# Altium footprint library lib_datalogger.PcbLib: 866 footprints (part 44 of 55)
Each footprint in its own frame and in the unit in brackets; x right, y up, seen from the top. Pads: shape width x height; smd on the part's side, far side on the other; paste and mask are expansions set on the pad; w line width, h text height; cw(c..) or ccw(c..) is an arc to the next point about the centre after c.
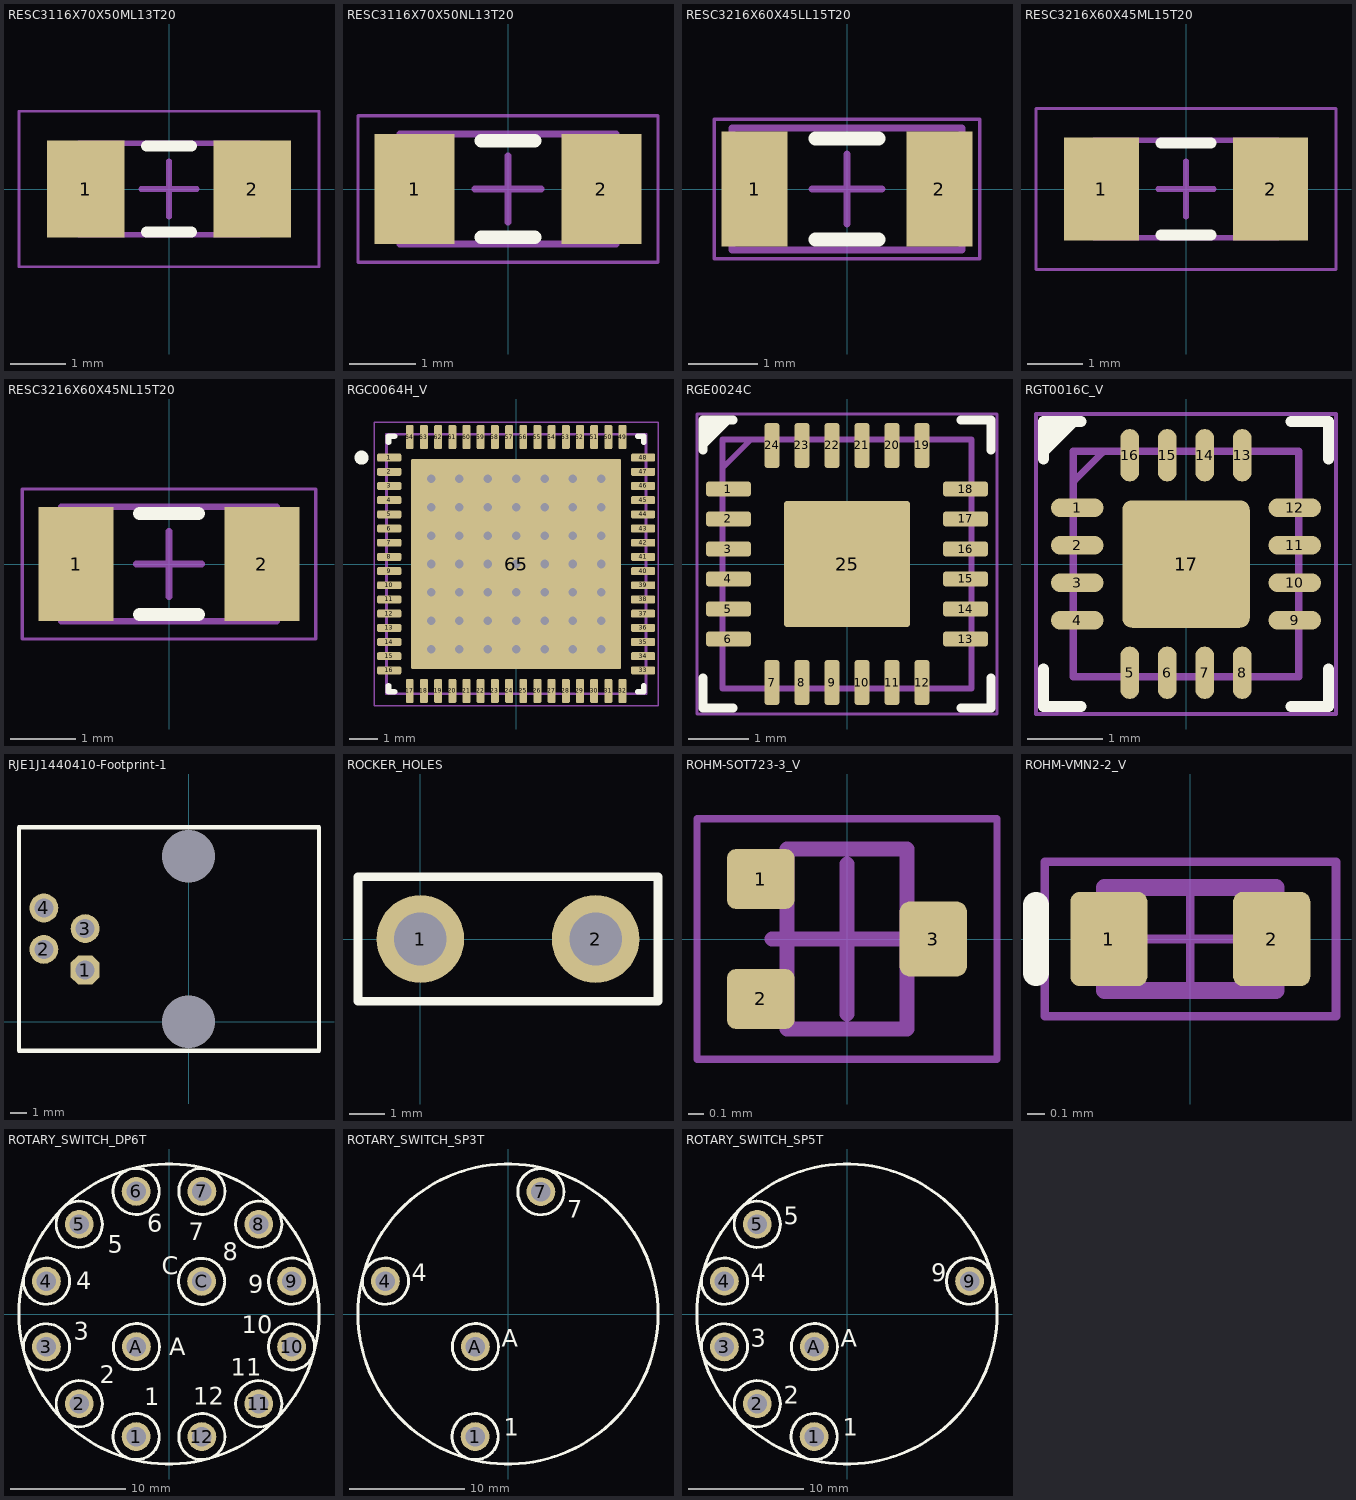
[diagram p43: the footprints below, top view; thin cyan lines are the x and y axes]

## RESC3116X70X50ML13T20 [mm] "Chip Resistor, 2-Leads, Body 3.25x1.65mm, IPC Low Density"
height 0.7
pads (2):
  rect 1.4x1.75 smd: 1(-1.5,0) 2(1.5,0)
Top Overlay:
  lines w0.2: -0.4,-0.775 0.4,-0.775 ; -0.4,0.775 0.4,0.775
Mechanical 13:
  lines w0.1: -1.625,-0.825 1.625,-0.825 1.625,0.825 -1.625,0.825 -1.625,-0.825
Mechanical 15:
  lines w0.05: -2.7,-1.4 2.7,-1.4 2.7,1.4 -2.7,1.4 -2.7,-1.4
  lines w0.1: -0.5,0 0.5,0 ; 0,-0.5 0,0.5
3D body "RESC3115X07M.step": height 0.7, standoff 0, extent -1.625,-0.825 1.625,0.825

## RESC3116X70X50NL13T20 [mm] "Chip Resistor, 2-Leads, Body 3.25x1.65mm, IPC Medium Density"
height 0.7
pads (2):
  rect 1.2x1.65 smd: 1(-1.4,0) 2(1.4,0)
Top Overlay:
  lines w0.2: -0.4,-0.725 0.4,-0.725 ; -0.4,0.725 0.4,0.725
Mechanical 13:
  lines w0.1: -1.625,-0.825 1.625,-0.825 1.625,0.825 -1.625,0.825 -1.625,-0.825
Mechanical 15:
  lines w0.05: -2.25,-1.1 2.25,-1.1 2.25,1.1 -2.25,1.1 -2.25,-1.1
  lines w0.1: -0.5,0 0.5,0 ; 0,-0.5 0,0.5
3D body "RESC3115X07N.step": height 0.7, standoff 0, extent -1.625,-0.825 1.625,0.825

## RESC3216X60X45LL15T20 [mm] "Chip Resistor, 2-Leads, Body 3.3x1.75mm, IPC High Density"
height 0.6
pads (2):
  rect 0.95x1.65 smd: 1(-1.325,0) 2(1.325,0)
Top Overlay:
  lines w0.2: -0.45,-0.725 0.45,-0.725 ; -0.45,0.725 0.45,0.725
Mechanical 13:
  lines w0.1: -1.65,-0.875 1.65,-0.875 1.65,0.875 -1.65,0.875 -1.65,-0.875
Mechanical 15:
  lines w0.05: -1.9,-1 1.9,-1 1.9,1 -1.9,1 -1.9,-1
  lines w0.1: -0.5,0 0.5,0 ; 0,-0.5 0,0.5
3D body "RESC3116X06L.step": height 0.6, standoff 0, extent -1.65,-0.875 1.65,0.875

## RESC3216X60X45ML15T20 [mm] "Chip Resistor, 2-Leads, Body 3.3x1.75mm, IPC Low Density"
height 0.6
pads (2):
  rect 1.35x1.85 smd: 1(-1.525,0) 2(1.525,0)
Top Overlay:
  lines w0.2: -0.45,-0.825 0.45,-0.825 ; -0.45,0.825 0.45,0.825
Mechanical 13:
  lines w0.1: -1.65,-0.875 1.65,-0.875 1.65,0.875 -1.65,0.875 -1.65,-0.875
Mechanical 15:
  lines w0.05: -2.7,-1.45 2.7,-1.45 2.7,1.45 -2.7,1.45 -2.7,-1.45
  lines w0.1: -0.5,0 0.5,0 ; 0,-0.5 0,0.5
3D body "RESC3116X06M.step": height 0.6, standoff 0, extent -1.65,-0.875 1.65,0.875

## RESC3216X60X45NL15T20 [mm] "Chip Resistor, 2-Leads, Body 3.3x1.75mm, IPC Medium Density"
height 0.6
pads (2):
  rect 1.15x1.75 smd: 1(-1.425,0) 2(1.425,0)
Top Overlay:
  lines w0.2: -0.45,-0.775 0.45,-0.775 ; -0.45,0.775 0.45,0.775
Mechanical 13:
  lines w0.1: -1.65,-0.875 1.65,-0.875 1.65,0.875 -1.65,0.875 -1.65,-0.875
Mechanical 15:
  lines w0.05: -2.25,-1.15 2.25,-1.15 2.25,1.15 -2.25,1.15 -2.25,-1.15
  lines w0.1: -0.5,0 0.5,0 ; 0,-0.5 0,0.5
3D body "RESC3116X06N.step": height 0.6, standoff 0, extent -1.65,-0.875 1.65,0.875

## RGC0064H_V [mm] "QFN, 64-Leads, Body 9x9mm, Pitch 0.5mm, Thermal Pad 7.4x7.4mm, TI Recommend"
height 1
pads (65):
  rrect36% 0.85x0.28 smd paste-0.025: 1(-4.475,3.75) 2(-4.475,3.25) 3(-4.475,2.75) 4(-4.475,2.25) 5(-4.475,1.75) 6(-4.475,1.25) 7(-4.475,0.75) 8(-4.475,0.25) 9(-4.475,-0.25) 10(-4.475,-0.75) 11(-4.475,-1.25) 12(-4.475,-1.75) 13(-4.475,-2.25) 14(-4.475,-2.75) 15(-4.475,-3.25) 16(-4.475,-3.75) 33(4.475,-3.75) 34(4.475,-3.25) 35(4.475,-2.75) 36(4.475,-2.25) 37(4.475,-1.75) 38(4.475,-1.25) 39(4.475,-0.75) 40(4.475,-0.25) 41(4.475,0.25) 42(4.475,0.75) 43(4.475,1.25) 44(4.475,1.75) 45(4.475,2.25) 46(4.475,2.75) 47(4.475,3.25) 48(4.475,3.75)
  rrect36% 0.28x0.85 smd paste-0.025: 17(-3.75,-4.475) 18(-3.25,-4.475) 19(-2.75,-4.475) 20(-2.25,-4.475) 21(-1.75,-4.475) 22(-1.25,-4.475) 23(-0.75,-4.475) 24(-0.25,-4.475) 25(0.25,-4.475) 26(0.75,-4.475) 27(1.25,-4.475) 28(1.75,-4.475) 29(2.25,-4.475) 30(2.75,-4.475) 31(3.25,-4.475) 32(3.75,-4.475) 49(3.75,4.475) 50(3.25,4.475) 51(2.75,4.475) 52(2.25,4.475) 53(1.75,4.475) 54(1.25,4.475) 55(0.75,4.475) 56(0.25,4.475) 57(-0.25,4.475) 58(-0.75,4.475) 59(-1.25,4.475) 60(-1.75,4.475) 61(-2.25,4.475) 62(-2.75,4.475) 63(-3.25,4.475) 64(-3.75,4.475)
  rrect1% 7.4x7.4 smd paste-4: 65(0,0)
via 1,-3 diameter 0.5 hole 0.3
via 2,-3 diameter 0.5 hole 0.3
via 3,-3 diameter 0.5 hole 0.3
via 1,-2 diameter 0.5 hole 0.3
via 2,-2 diameter 0.5 hole 0.3
via 3,-2 diameter 0.5 hole 0.3
via 1,-1 diameter 0.5 hole 0.3
via 2,-1 diameter 0.5 hole 0.3
via 3,-1 diameter 0.5 hole 0.3
via 1,0 diameter 0.5 hole 0.3
via 2,0 diameter 0.5 hole 0.3
via 3,0 diameter 0.5 hole 0.3
via 1,1 diameter 0.5 hole 0.3
via 2,1 diameter 0.5 hole 0.3
via 3,1 diameter 0.5 hole 0.3
via 1,2 diameter 0.5 hole 0.3
via 2,2 diameter 0.5 hole 0.3
via 3,2 diameter 0.5 hole 0.3
via 1,3 diameter 0.5 hole 0.3
via 2,3 diameter 0.5 hole 0.3
via 3,3 diameter 0.5 hole 0.3
via -2,-3 diameter 0.5 hole 0.3
via -1,-3 diameter 0.5 hole 0.3
via 0,-3 diameter 0.5 hole 0.3
via -2,-2 diameter 0.5 hole 0.3
via -1,-2 diameter 0.5 hole 0.3
via 0,-2 diameter 0.5 hole 0.3
via -2,-1 diameter 0.5 hole 0.3
via -1,-1 diameter 0.5 hole 0.3
via 0,-1 diameter 0.5 hole 0.3
via -2,1 diameter 0.5 hole 0.3
via -1,1 diameter 0.5 hole 0.3
via 0,1 diameter 0.5 hole 0.3
via -2,2 diameter 0.5 hole 0.3
via -1,2 diameter 0.5 hole 0.3
via 0,2 diameter 0.5 hole 0.3
via -2,3 diameter 0.5 hole 0.3
via -1,3 diameter 0.5 hole 0.3
via 0,3 diameter 0.5 hole 0.3
via -3,1 diameter 0.5 hole 0.3
via -3,2 diameter 0.5 hole 0.3
via -3,3 diameter 0.5 hole 0.3
via -3,-3 diameter 0.5 hole 0.3
via -3,-2 diameter 0.5 hole 0.3
via -3,-1 diameter 0.5 hole 0.3
via -3,0 diameter 0.5 hole 0.3
via -2,0 diameter 0.5 hole 0.3
via -1,0 diameter 0.5 hole 0.3
via 0,0 diameter 0.5 hole 0.3
Top Overlay:
  circle w0.25: c-5.45,3.75 r0.125
  lines w0.2: -4.5,-4.29 -4.5,-4.5 -4.29,-4.5 ; -4.5,4.29 -4.5,4.5 -4.29,4.5 ; 4.29,-4.5 4.5,-4.5 4.5,-4.29 ; 4.29,4.5 4.5,4.5 4.5,4.29
Top Paste:
  region: 1.65,-0.15 0.15,-0.15 0.15,-1.65 1.65,-1.65
  region: 3.45,-0.15 1.95,-0.15 1.95,-1.65 3.45,-1.65
  rectangle: -3.45,-1.65 -1.95,-0.15
  rectangle: -1.65,-1.65 -0.15,-0.15
  rectangle: -1.65,0.15 -0.15,1.65
  rectangle: -3.45,0.15 -1.95,1.65
  region: 3.45,1.65 1.95,1.65 1.95,0.15 3.45,0.15
  region: 1.65,1.65 0.15,1.65 0.15,0.15 1.65,0.15
  rectangle: -1.65,1.95 -0.15,3.45
  rectangle: -3.45,1.95 -1.95,3.45
  region: 3.45,3.45 1.95,3.45 1.95,1.95 3.45,1.95
  region: 1.65,3.45 0.15,3.45 0.15,1.95 1.65,1.95
  region: 1.65,-1.95 0.15,-1.95 0.15,-3.45 1.65,-3.45
  region: 3.45,-1.95 1.95,-1.95 1.95,-3.45 3.45,-3.45
  rectangle: -3.45,-3.45 -1.95,-1.95
  rectangle: -1.65,-3.45 -0.15,-1.95
Mechanical 1:
  text ".Designator" at -1.524,-0.508 h1.02
Mechanical 13:
  lines w0.1: -4.575,-4.575 4.575,-4.575 4.575,4.575 -4.575,4.575 -4.575,-4.575
Mechanical 15:
  lines w0.05: -5,-5 5,-5 5,5 -5,5 -5,-5
  lines w0.1: -0.5,0 0.5,0 ; 0,-0.5 0,0.5
3D body "PQFN50P900X900X100_HS-65N.step": height 1, standoff 0, extent -4.575,-4.575 4.575,4.575

## RGE0024C [mm] "QFN, 24-Leads, Body 4x4mm, Pitch 0.5mm, Thermal Pad 2.1x2.1mm"
height 1
pads (25):
  rrect42% 0.75x0.25 smd: 1(-1.975,1.25) 2(-1.975,0.75) 3(-1.975,0.25) 4(-1.975,-0.25) 5(-1.975,-0.75) 6(-1.975,-1.25) 13(1.975,-1.25) 14(1.975,-0.75) 15(1.975,-0.25) 16(1.975,0.25) 17(1.975,0.75) 18(1.975,1.25)
  rrect42% 0.25x0.75 smd: 7(-1.25,-1.975) 8(-0.75,-1.975) 9(-0.25,-1.975) 10(0.25,-1.975) 11(0.75,-1.975) 12(1.25,-1.975) 19(1.25,1.975) 20(0.75,1.975) 21(0.25,1.975) 22(-0.25,1.975) 23(-0.75,1.975) 24(-1.25,1.975)
  rrect5% 2.1x2.1 smd paste-1.05: 25(0,0)
Top Overlay:
  region: -2.4,2.4 -2.4,2 -2,2.4
  lines w0.15: -2.4,-1.9 -2.4,-2.4 -1.9,-2.4 ; -2.4,1.9 -2.4,2.4 -1.9,2.4 ; -2.4,2 -2,2.4 ; 1.9,-2.4 2.4,-2.4 2.4,-1.9 ; 1.9,2.4 2.4,2.4 2.4,1.9
Top Paste:
  rectangle: 0.1,0.1 1.039,1.039
  region: -0.1,1.039 -1.039,1.039 -1.039,0.1 -0.1,0.1
  region: -0.1,-0.1 -1.039,-0.1 -1.039,-1.039 -0.1,-1.039
  rectangle: 0.1,-1.039 1.039,-0.1
Mechanical 13:
  lines w0.1: -2.075,1.6 -1.6,2.075 ; -2.075,-2.075 -2.075,2.075 2.075,2.075 2.075,-2.075 -2.075,-2.075
Mechanical 15:
  lines w0.05: -2.5,-2.5 -2.5,2.5 2.5,2.5 2.5,-2.5 -2.5,-2.5
  lines w0.1: -0.5,0 0.5,0 ; 0,-0.5 0,0.5
Top Designator:
  text ".Designator" at -1.854,-0.508 h0.6
3D body "pca9555_RGE24_2P1X2P1.stp": height 1, standoff 0, extent -2.126,-2.126 2.126,2.126

## RGT0016C_V [mm] "QFN, 16-Leads, Body 3x3mm, Pitch 0.5mm, Thermal Pad 1.65x1.65mm"
height 1
pads (17):
  rrect100% 0.7x0.25 smd: 1(-1.45,0.75) 2(-1.45,0.25) 3(-1.45,-0.25) 4(-1.45,-0.75) 9(1.45,-0.75) 10(1.45,-0.25) 11(1.45,0.25) 12(1.45,0.75)
  rrect100% 0.25x0.7 smd: 5(-0.75,-1.45) 6(-0.25,-1.45) 7(0.25,-1.45) 8(0.75,-1.45) 13(0.75,1.45) 14(0.25,1.45) 15(-0.25,1.45) 16(-0.75,1.45)
  rrect15% 1.7x1.7 smd: 17(0,0)
Top Overlay:
  region: -1.9,1.9 -1.9,1.5 -1.5,1.9
  lines w0.15: -1.9,-1.4 -1.9,-1.9 -1.4,-1.9 ; -1.9,1.4 -1.9,1.9 -1.4,1.9 ; -1.9,1.5 -1.5,1.9 ; 1.4,-1.9 1.9,-1.9 1.9,-1.4 ; 1.4,1.9 1.9,1.9 1.9,1.4
Mechanical 13:
  lines w0.1: -1.5,1.1 -1.1,1.5 ; -1.5,-1.5 1.5,-1.5 1.5,1.5 -1.5,1.5 -1.5,-1.5
Mechanical 15:
  lines w0.05: -2,-2 2,-2 2,2 -2,2 -2,-2
  lines w0.1: -0.5,0 0.5,0 ; 0,-0.5 0,0.5
Top Designator:
  text ".Designator" at -1.524,-0.4 h0.6
3D body "QFN-16.STEP": height 0.97, standoff 0, extent -1.501,-1.501 1.501,1.501

## RJE1J1440410-Footprint-1 [mil]
pads (6):
  oct 70x70 hole 46: 1(-250,125)
  round 70 hole 46: 2(-350,175) 3(-250,225) 4(-350,275)
  round 0 hole 128: 5(0,0) 6(0,400)
Top Overlay:
  lines w10: -410,-70 -410,470 315,470 315,-70 -410,-70
3D body "ACC-M-RJE02-164-0X21-REVT1.step": height 636.92, standoff -136.7, extent -394.92,-115.08 414.92,505

## ROCKER_HOLES [mm]
pads (2):
  round 2.5 hole 1.5: 1(0,0) 2(5,0)
Top Overlay:
  lines w0.254: -1.782,-1.778 -1.782,1.778 6.782,1.778 6.782,-1.778 -1.782,-1.778

## ROCKER_SWITCH [mm]
3D body "ROCKER_SWITCH.step": height 5, standoff -24.18, extent 0,-21.082 9.5,0

## ROHM-SOT723-3_V [mm] "SOT723, 3-Leads, Body 1.2x0.8mm, Pitch 0.8mm"
height 0.55
pads (3):
  rrect30% 0.45x0.4 smd: 1(-0.575,0.4) 2(-0.575,-0.4)
  rrect30% 0.45x0.5 smd: 3(0.575,0)
Mechanical 13:
  lines w0.1: -0.4,-0.6 -0.4,0.6 0.4,0.6 0.4,-0.6 -0.4,-0.6
Mechanical 15:
  lines w0.05: -1,-0.8 1,-0.8 1,0.8 -1,0.8 -1,-0.8
  lines w0.1: -0.5,0 0.5,0 ; 0,-0.5 0,0.5
Top Designator:
  text ".Designator" at -1.27,-0.127 h0.6
3D body "SOT-723.STEP": height 0.45, standoff -0.01, extent -0.525,-0.625 0.525,0.625

## ROHM-VMN2-2_V [mm] "VMN2, 2-Leads, Body 0.9x0.6mm, Pitch 0.95mm"
height 0.4
pads (2):
  rrect25% 0.45x0.55 smd: 1(-0.475,0) 2(0.475,0)
Top Overlay:
  lines w0.15: -0.9,-0.2 -0.9,0.2
Mechanical 13:
  lines w0.1: -0.5,-0.3 -0.5,0.3 0.5,0.3 0.5,-0.3 -0.5,-0.3
Mechanical 15:
  lines w0.05: -0.275,0 0.275,0 ; 0,-0.275 0,0.275 ; -0.85,-0.45 -0.85,0.45 0.85,0.45 0.85,-0.45 -0.85,-0.45
Top Designator:
  text ".Designator" at -1.27,-0.127 h0.6
3D body "VMN2.STEP": height 0.37, standoff -0.01, extent -0.5,-0.3 0.5,0.3

## ROTARY_SWITCH_DP6T [mm]
pads (14):
  round 2.5 hole 1.7: 1(-2.847,-10.625) 2(-7.778,-7.778) 3(-10.625,-2.847) 4(-10.625,2.847) 5(-7.778,7.778) 6(-2.847,10.625) 7(2.847,10.625) 8(7.778,7.778) 9(10.625,2.847) 10(10.625,-2.847) 11(7.778,-7.778) 12(2.847,-10.625) A(-2.828,-2.828) C(2.828,2.828)
Top Overlay:
  circle w0.254: c2.828,2.828 r2
  circle w0.254: c2.847,-10.625 r2
  circle w0.254: c7.778,-7.778 r2
  circle w0.254: c10.625,-2.847 r2
  circle w0.254: c10.625,2.847 r2
  circle w0.254: c7.778,7.778 r2
  circle w0.254: c2.847,10.625 r2
  circle w0.254: c-2.847,10.625 r2
  circle w0.254: c-2.828,-2.828 r2
  circle w0.254: c-7.778,7.778 r2
  circle w0.254: c-10.625,2.847 r2
  circle w0.254: c-10.625,-2.847 r2
  circle w0.254: c-7.778,-7.778 r2
  circle w0.254: c-2.847,-10.625 r2
  circle w0.254: c0,0 r13
  text "8" at 4.67,4.67 h1.52
  text "C" at -0.635,3.429 h1.52
  text "6" at -1.906,7.112 h1.52
  text "12" at 2.108,-7.868 h1.52
  text "11" at 5.359,-5.359 h1.52
  text "10" at 6.299,-1.688 h1.52
  text "9" at 6.87,1.841 h1.52
  text "7" at 1.709,6.379 h1.52
  text "A" at 0,-3.556 h1.52
  text "5" at -5.309,5.309 h1.52
  text "4" at -8.052,2.157 h1.52
  text "3" at -8.255,-2.212 h1.52
  text "2" at -5.994,-5.994 h1.52
  text "1" at -2.123,-7.925 h1.52
3D body "rotaryswitch-KC15A9.501xPx.stp": height 32, standoff -3, extent -13,-13 13,13

## ROTARY_SWITCH_SP3T [mm]
pads (4):
  round 2.5 hole 1.7: 1(-2.847,-10.625) 4(-10.625,2.847) 7(2.847,10.6) A(-2.828,-2.828)
Top Overlay:
  circle w0.254: c-2.828,-2.828 r2
  circle w0.254: c-10.625,2.847 r2
  circle w0.254: c-2.847,-10.625 r2
  circle w0.254: c0,0 r13
  circle w0.254: c2.847,10.6 r2
  text "A" at -0.533,-2.819 h1.52
  text "4" at -8.331,2.845 h1.52
  text "1" at -0.381,-10.566 h1.52
  text "7" at 5.131,8.331 h1.52
3D body "rotaryswitch-KC15A9.501xPx.stp": height 32, standoff -3, extent -13,-13 13,13

## ROTARY_SWITCH_SP5T [mm]
pads (7):
  round 2.5 hole 1.7: 1(-2.847,-10.625) 2(-7.778,-7.778) 3(-10.625,-2.847) 4(-10.625,2.847) 5(-7.778,7.778) 9(10.625,2.847) A(-2.828,-2.828)
Top Overlay:
  circle w0.254: c-2.828,-2.828 r2
  circle w0.254: c10.625,2.847 r2
  circle w0.254: c-7.778,7.778 r2
  circle w0.254: c-10.625,2.847 r2
  circle w0.254: c-10.625,-2.847 r2
  circle w0.254: c-7.778,-7.778 r2
  circle w0.254: c-2.847,-10.625 r2
  circle w0.254: c0,0 r13
  text "A" at -0.533,-2.819 h1.52
  text "9" at 7.315,2.845 h1.52
  text "5" at -5.486,7.772 h1.52
  text "4" at -8.331,2.845 h1.52
  text "3" at -8.331,-2.845 h1.52
  text "2" at -5.486,-7.772 h1.52
  text "1" at -0.381,-10.566 h1.52
3D body "rotaryswitch-KC15A9.501xPx.stp": height 32, standoff -3, extent -13,-13 13,13